# Altium schematic symbol library BARKO_SCHLIB.SchLib: 1064 symbols (part 4 of 11) (continued)
## IC-CD4013BM96G4 (continued)
IC FF D-TYPE DUAL 1BIT 14SOIC; Manufacturer: Texas Instruments; Manufacturer Part Number: CD4013BM96G4; Polarity: Non-Inverting; Frequency: 24MHz; Logic Function: AND,D-Type; Max Supply Voltage: 18V; Min Supply Voltage: 3V; Number of Bits: 2; Propagation Delay: 300ns; Clock Edge Trigger Type: Positive Edge; Turn-On Delay Time: 45ns; High Level Output Current: -4.2mA; Low Level Output Current: 6.8mA; Number of Bits per Element: 1; Number of Outputs: 4; Quiescent Current: 20uA; Washability: OK; .Creator: M.OZKAN; .PCBCHK: USED; Supplier 1: Digi-Key; Supplier Part Number 1: 296-31487-1-ND; Stock: 8095; Pricing: 1=0.41, 10=0.353, 25=0.3292, 100=0.2632, 250=0.2444, 500=0.2068, 1000=0.1598 (USD); RoHS: Yes; Mount: Surface Mount; Case/Package: SOIC; Number of Pins: 14; Weight: 0.004564oz; Contact Plating: Gold; Min Operating Temperature: -55°C; Max Operating Temperature: 125°C; Packaging: Tape and Reel; Number of Elements: 2; Number of Circuits: 2; Package Quantity: 2500; Number of Input Lines: 1; Number of Output Lines: 1; Length: 8.65mm; Height: 1.58mm; Width: 3.91mm; Radiation Hardening: No; Lead Free: Lead Free; ComponentLink1URL: https://datasheet.ciiva.com/26054/cd4013b-mil-26054901.pdf?src-supplier=Avnet+Europe; ComponentLink1Description: https://datasheet.ciiva.com/26054/cd4013b-mil-26054901.pdf?src-supplier=Avnet+Europe; .SCHCHK: USED
footprint SOIC14
pins: 1 Q1 (out), 2 Q1 (out), 3 CLOCK1 (in), 4 RESET1 (in), 5 D1 (in), 6 SET1 (in), 7 VSS (power), 8 SET2 (in), 9 D2 (in), 10 RESET2 (in), 11 CLOCK2 (in), 12 Q2 (out), 13 Q2 (out), 14 VDD (power)

## IC-CD4066BM96
designator U?, comment CD4066BM96  Case/Package: SOIC14
IC QUAD BILATERAL SWITCH 14-SOIC; Manufacturer: Texas Instruments; Number of Inputs: 4; Min Supply Voltage: 3V; Max Supply Voltage: 18V; Supply Type: Dual,Single; Min Dual Supply Voltage: 1.5V; Max Dual Supply Voltage: 9V; Bandwidth: 40MHz; Dual Supply Voltage: 7.5V; On-State Resistance: 240R; Turn-On Delay Time: 30ns; Max Supply Current: 5uA; Polarity: Non-Inverting; Throw Configuration: SPST; Quiescent Current: 20nA; .PCBCHK: USED; .Creator: F:TALI; Washability: OK; Supplier 1: Digi-Key; Manufacturer Part Number: CD4066BM96; Stock 1: 71359; Pricing 1: 1=0.42, 10=0.363, 100=0.2711, 500=0.213, 1000=0.16459 (USD); Mount: Surface Mount; Number of Pins: 14; Weight: 0.004318oz; Contact Plating: Gold; Min Operating Temperature: -55°C; Max Operating Temperature: 125°C; Number of Outputs: 4; Packaging: Tape and Reel; Package Quantity: 2500; Independent Circuits: 4; Number of Channels: 4; Turn-Off Delay Time: 30ns; Number of Bits: 4; Length: 8.65mm; Height: 1.58mm; Width: 3.91mm; Radiation Hardening: No; Lead Free: Lead Free; REACH SVHC: No SVHC; ComponentLink1URL: http://www.farnell.com/datasheets/1874823.pdf; ComponentLink1Description: http://www.farnell.com/datasheets/1874823.pdf; ComponentLink2URL: http://www.ti.com/lit/ds/symlink/cd4066b.pdf; ComponentLink2Description: http://www.ti.com/lit/ds/symlink/cd4066b.pdf; ComponentLink3URL: http://www.ti.com/general/docs/lit/getliterature.tsp?genericPartNumber=CD4066B-MIL&&fileType=pdf; ComponentLink3Description: http://www.ti.com/general/docs/lit/getliterature.tsp?genericPartNumber=CD4066B-MIL&&fileType=pdf; ComponentLink4URL: https://www.verical.com/server-webapp/html/getDatasheet?partID=50227; ComponentLink4Description: https://www.verical.com/server-webapp/html/getDatasheet?partID=50227; ComponentLink5URL: http://focus.ti.com/lit/ds/symlink/cd4066b.pdf; ComponentLink5Description: http://focus.ti.com/lit/ds/symlink/cd4066b.pdf; Supplier Part Number 1: 296-14475-6-ND; .SCHCHK: USED
footprint SOIC14
pins: 1 SIGA-IN/OUT, 2 SIGA-OUT/IN, 3 SIGB-OUT/IN, 4 SIGB-IN/OUT, 5 CONTROLB, 6 CONTROLC, 7 GND, 8 SIGC-IN/OUT, 9 SIGC-OUT/IN, 10 SIGD-OUT/IN, 11 SIGD-/IN/OUT, 12 CONTROLD, 13 CONTROLA, 14 VCC

## IC-CD4067BM96G4
designator U?, comment CD4067BM96G4  Case/Package: SOIC24
IC MUX/DEMUX 1X16 24SOIC; Manufacturer: Texas Instruments; Bandwidth: 14MHz; Min Supply Voltage: 3V; Max Supply Voltage: 18V; On-State Resistance: 240R; Turn-On Delay Time: 650ns; Turn-Off Delay Time: 440ns; Supply Type: Single; Nominal Supply Current: 100uA; Propagation Delay: 60ns; Max Power Dissipation: 500mW; Number of Inputs: 16; Number of Outputs: 1; Operating Supply Current: 80nA; Logic Function: Multiplexer,Demultiplexer; Washability: OK; .Creator: M.OZKAN; .PCBCHK: USED; Supplier 1: Digi-Key; Manufacturer Part Number: CD4067BM96G4; Stock 1: 0; Pricing 1: 2000=0,52269 (USD); RoHS: Yes; Mount: Surface Mount; Number of Pins: 24; Weight: 0.02187oz; Contact Plating: Gold; Min Operating Temperature: -55°C; Max Operating Temperature: 125°C; Packaging: Tape and Reel; Package Quantity: 2000; Number of Channels: 1; Power Dissipation: 500mW; Number of Bits: 16; Lead Free: Lead Free; ComponentLink1URL: https://datasheet.ciiva.com/1682/cd4067b-1682287.pdf?src-supplier=Digi-Key; ComponentLink1Description: https://datasheet.ciiva.com/1682/cd4067b-1682287.pdf?src-supplier=Digi-Key; Supplier Part Number 1: CD4067BM96G4-ND; .SCHCHK: USED
footprint SOIC24
pins: 1 OUT, 2 S7, 3 S6, 4 S5, 5 S4, 6 S3, 7 S2, 8 S1, 9 S0, 10 A, 11 B, 12 GND, 13 D, 14 C, 15 INH, 16 S15, 17 S14, 18 S13, 19 S12, 20 S11, 21 S10, 22 S9, 23 S8, 24 VCC

## IC-CPC1117NTR
designator U?, comment CPC1117NTR  Case/Package: SOP4
SSR RELAY SPST-NC 150MA 0-60V; Manufacturer: Ixys Clare; Output Voltage: 60V; Throw Configuration: SPST; On-State Resistance: 16R; Isolation Voltage: 1.5kV; Max Input Current: 50mA; Voltage Rating: 50V; Contact Resistance: 20mR; Max Voltage Rating (DC): 5.05kV; Current Rating: 1A; Number of Positions: 5; Gender: Male; Connector Type: Male Pin; Pitch: 1mm; Glow Wire Compliant: Non-compliant; Washability: OK; .Creator: M.OZKAN; .PCBCHK: USED; Supplier 1: Future Electronics; Manufacturer Part Number: CPC1117NTR; Stock 1: 93488; Pricing 1: 1=2,60000, 100=1,95000, 250=1,84000, 500=1,77000, 1000=1,69000 (USD); RoHS: Yes; Mount: Surface Mount; Number of Pins: 4; Min Operating Temperature: -40°C; Max Operating Temperature: 85°C; Packaging: Tape and Reel; Max Output Current: 150mA; Package Quantity: 2000; Output Current: 150mA; Termination: Gull Wing; Load Current: 150mA; Max Output Voltage: 60V; Input Current: 50mA; Relay Type: Relay; Length: 4.089mm; Height: 2.184mm; Width: 3.8mm; Radiation Hardening: No; ComponentLink1URL: https://datasheet.ciiva.com/16498/cpc1117ntr-16498380.pdf?src-supplier=Future+Electronics; ComponentLink1Description: https://datasheet.ciiva.com/16498/cpc1117ntr-16498380.pdf?src-supplier=Future+Electronics; ComponentLink2URL: https://datasheet.ciiva.com/2421/cpc1117n-2421253.pdf?src-supplier=Digi-Key; ComponentLink2Description: https://datasheet.ciiva.com/2421/cpc1117n-2421253.pdf?src-supplier=Digi-Key; ComponentLink3URL: https://datasheet.ciiva.com/2421/cpc1117n-2421254.pdf?src-supplier=Digi-Key; ComponentLink3Description: https://datasheet.ciiva.com/2421/cpc1117n-2421254.pdf?src-supplier=Digi-Key; ComponentLink4URL: https://datasheet.ciiva.com/2421/cpc1117n-2421255.pdf?src-supplier=Digi-Key; ComponentLink4Description: https://datasheet.ciiva.com/2421/cpc1117n-2421255.pdf?src-supplier=Digi-Key; ComponentLink5URL: https://datasheet.ciiva.com/39122/3cpc1117n-39122778.pdf?src-supplier=Onlinecomponents.com; ComponentLink5Description: https://datasheet.ciiva.com/39122/3cpc1117n-39122778.pdf?src-supplier=Onlinecomponents.com; Supplier Part Number 1: CPC1117NTR-CUTT; Color: Natural; Contact Plating: Tin; Contact Material: Bronze,Tin; Housing Color: Natural; Housing Material: Nylon; Number of Rows: 1; Voltage Rating (AC): 50V; Fastening Type: Detent; Number of Contacts: 5; Max Voltage Rating (AC): 50V; Contact Gender: Male; Orientation: Vertical; Number of Circuits: 5; Depth: 3.6mm; REACH SVHC: Unknown; Lead Free: Lead Free; ComponentLink6URL: https://datasheet.ciiva.com/11748/0900766b80b0af91-11748006.pdf?src-supplier=RSComponents; ComponentLink6Description: https://datasheet.ciiva.com/11748/0900766b80b0af91-11748006.pdf?src-supplier=RSComponents; ComponentLink7URL: https://datasheet.ciiva.com/30169/101445013310507-pcb-headers-30169975.pdf?src-supplier=Onlinecomponents.com; ComponentLink7Description: https://datasheet.ciiva.com/30169/101445013310507-pcb-headers-30169975.pdf?src-supplier=Onlinecomponents.com; ComponentLink8URL: https://datasheet.ciiva.com/9469/5013310507-pcb-headers-9469065.pdf?src-supplier=Avnet; ComponentLink8Description: https://datasheet.ciiva.com/9469/5013310507-pcb-headers-9469065.pdf?src-supplier=Avnet; ComponentLink9URL: https://datasheet.ciiva.com/5156/5013310507-pcb-headers-179252-5156221.pdf?src-supplier=Mouser; ComponentLink9Description: https://datasheet.ciiva.com/5156/5013310507-pcb-headers-179252-5156221.pdf?src-supplier=Mouser; ComponentLink10URL: https://datasheet.ciiva.com/7683/1631871-7683719.pdf?src-supplier=Element14; ComponentLink10Description: https://datasheet.ciiva.com/7683/1631871-7683719.pdf?src-supplier=Element14; .SCHCHK: USED
footprint SOP_4
pins: 1 A (in), 2 K (out), 3 OUT_AC2 (io), 4 OUT_AC1 (io)

## IC-CPC2017NTR
designator U?, comment CPC2017
RELAY SSR OPTOMOS DUAL NO 8-SOIC; Manufacturer: Ixys Clare; Manufacturer Part Number: CPC2017NTR; Output Current: 120mA; On-State Resistance: 16R; Max Output Voltage: 60V; Isolation Voltage: 1.5kV; Throw Configuration: DPST; Input Current: 50mA; Washability: OK; .Creator: M.OZKAN; .PCBCHK: USED; Supplier 1: Digi-Key; Supplier Part Number 1: 212-CPC2017NCT-ND; Stock 1: 1521; Pricing 1: 1=1.48000, 10=1.38600, 25=1.23200, 50=1.17040, 100=1.10880, 250=0.98560, 500=0.92400, 1000=0.86240 (USD); RoHS: Yes; Mount: Surface Mount; Case/Package: SOP; Min Operating Temperature: -40°C; Max Operating Temperature: 85°C; Package Quantity: 2000; Packaging: Tape and Reel; Load Current: 120mA; Termination: Gull Wing; Relay Type: Relay; Radiation Hardening: No; Lead Free: Lead Free; ComponentLink1URL: http://components.arrow.com/part/dataview/57219127S8988520N2018?src-supplier=Arrow; ComponentLink1Description: http://components.arrow.com/part/dataview/57219127S8988520N2018?src-supplier=Arrow; ComponentLink2URL: http://www.mouser.com/ds/2/205/CPC2017N-275017.pdf?src-supplier=Mouser; ComponentLink2Description: http://www.mouser.com/ds/2/205/CPC2017N-275017.pdf?src-supplier=Mouser; ComponentLink3URL: http://www.ixysic.com/home/pdfs.nsf/www/CPC2017N.pdf/file/CPC2017N.pdf?src-supplier=Digi-Key; ComponentLink3Description: http://www.ixysic.com/home/pdfs.nsf/www/CPC2017N.pdf/file/CPC2017N.pdf?src-supplier=Digi-Key; .SCHCHK: USED
footprint 8-SOP 2.54mm Pitch (8-SOP (0.150", 3.81mm Width))
pins: 1, 2, 3, 4, 5, 6, 7, 8

## IC-CSR1010A05-IQQM-R
designator U?, comment CSR1010A05-IQQM-R  Package: QFN-32
IC RF TXRX+MCU BLUETOOTH 32UFQFN; Manufacturer: Qualcomm; .Creator: F:TALI; .PCBCHK: USED; Washability: OK; Supplier 1: Digi-Key; Manufacturer Part Number: CSR1010A05-IQQM-R; Stock 1: 14468; Pricing 1: 1=2.57, 10=2.323, 25=2.0736, 100=1.8664, 250=1.659, 500=1.45162, 1000=1.20278 (USD); Supplier Part Number 1: CSR1010A05-IQQM-RDKR-ND; .SCHCHK: USED
footprint QFN-32
pins: 0 GND, 1 VDD_BAT, 2 XTAL_32K_OUT, 3 XTAL_32K_IN, 4 WAKE, 5 VDD_CORE, 6 VDD_REG_IN, 7 RF, 8 VDD_XTAL, 9 XTAL_16M_OUT, 10 XTAL_16M_IN, 11 AIO[2], 12 AIO[1], 13 AIO[0], 14 PIO[1] /UART_TX, 15 PIO[1] /UART_RX, 16 PIO[3] /SF_DIN, 17 PIO[4] /SF_CS#, 18 PIO[5] /DEBUG_CLK, 19 PIO[6] /DEBUG_CS#, 20 PIO[7] /DEBUG_MOSI, 21 VDD_PADS, 22 PIO[8] /DEBUG_MISO, 23 PIO[9], 24 PIO[10], 25 PIO[11], 26 SPI_PIO#, 27 PIO[2], 28 I2C_SCL, 29 I2C_SDA, 30 VDD_CORE, 31 SMPS_LX, 32 VDD_BAT_SMPS

## IC-DAC5311IDCKR
designator U?, comment DAC5311
IC DAC 8BIT 1CH LP SC70-6; Manufacturer: Texas Instruments; Manufacturer Part Number: DAC5311IDCKR; Number of Channels: 1; Max Supply Voltage: 5.5V; Min Supply Voltage: 2V; Max Power Dissipation: 880uW; Interface: SPI; Settling Time: 6us; Number of Bits: 8; Resolution: 8b; Sampling Rate: 225KS/s; Supply Type: Single; Integral Nonlinearity (INL): 0.25LSB; Spurious-free dynamic range (SFDR): 65dB; Signal to Noise Ratio (SNR): 81dB; Nominal Supply Current: 110uA; Polarity: Unipolar; Output Type: Voltage; .Creator: F:TALI; .PCBCHK: USED; Washability: OK; Supplier 1: Digi-Key; Supplier Part Number 1: 296-24180-6-ND; Stock 1: 19970; Pricing 1: 1=1.5, 10=1.337, 100=1.0424, 500=0.86108, 1000=0.6798 (USD); Case/Package: SC; Number of Pins: 6; Contact Plating: Gold; Min Operating Temperature: -40°C; Max Operating Temperature: 125°C; Packaging: Tape and Reel; Package Quantity: 3000; Number of DAC Channels: 1; Number of Converters: 1; Conversion Rate: 225KS/s; Differential Nonlinearity: 0.25LSB; Radiation Hardening: No; REACH SVHC: No SVHC; Lead Free: Lead Free; ComponentLink1URL: http://www.farnell.com/datasheets/1725053.pdf?src-supplier=Element14; ComponentLink1Description: http://www.farnell.com/datasheets/1725053.pdf?src-supplier=Element14; ComponentLink2URL: http://www.ti.com/lit/ds/symlink/dac5311.pdf?src-supplier=Digi-Key; ComponentLink2Description: http://www.ti.com/lit/ds/symlink/dac5311.pdf?src-supplier=Digi-Key; ComponentLink3URL: http://www.produktinfo.conrad.com/datenblaetter/1100000-1199999/001186518-da-01-en-IC_DAC_8BIT_1CH_DAC5311IDCKR_SC_70_6_TID.pdf?src-supplier=Conrad; ComponentLink3Description: http://www.produktinfo.conrad.com/datenblaetter/1100000-1199999/001186518-da-01-en-IC_DAC_8BIT_1CH_DAC5311IDCKR_SC_70_6_TID.pdf?src-supplier=Conrad; .SCHCHK: USED
footprint SOT-363
pins: 1 ~{SYNC}, 2 SCLK, 3 DIN, 4 AVDD, 5 GND, 6 VOUT

## IC-DMG6968UDM-7
designator U?, comment DMG6968
MOSFET 2N-CH 20V 6.5A SOT-26; Manufacturer: Diodes; Manufacturer Part Number: DMG6968UDM-7; Number of Channels: 2; Element Configuration: Dual; Gate to Source Voltage (Vgs): 8V; On-State Resistance: 24mR; Power Dissipation: 850mW; Turn-Off Delay Time: 562ns; Turn-On Delay Time: 53ns; Fall Time: 234ns; Input Capacitance: 143pF; Rise Time: 78ns; FET Type: 2 N-Channel; Washability: OK; .Creator: M.OZKAN; .PCBCHK: USED; RoHS: Yes; Category: MOSFETs; Mount: Surface Mount; Case/Package: SOT-26; Number of Pins: a; Min Operating Temperature: -55°C; Max Operating Temperature: 150°C; Drain to Source Voltage (Vdss): 20V; Continuous Drain Current (ID): 6.5A; Drain to Source Breakdown Voltage: 20V; Drain to Source Resistance: 24mR; Package Quantity: 3000; Packaging: Tape and Reel; Rds On Max: 24mR; Max Power Dissipation: 850mW; Number of Elements: 2; Length: 3mm; Height: 1.1mm; Width: 1.6mm; Radiation Hardening: No; REACH SVHC: No SVHC; Lead Free: Lead Free; ComponentLink1URL: https://datasheet.ciiva.com/929/ds31758-929568.pdf?src-supplier=Digi-Key; ComponentLink1Description: https://datasheet.ciiva.com/929/ds31758-929568.pdf?src-supplier=Digi-Key; ComponentLink2URL: https://datasheet.ciiva.com/11174/ds31758-11174898.pdf?src-supplier=Avnet; ComponentLink2Description: https://datasheet.ciiva.com/11174/ds31758-11174898.pdf?src-supplier=Avnet; ComponentLink3URL: https://datasheet.ciiva.com/4443/ds31758-90272-4443012.pdf?src-supplier=Mouser; ComponentLink3Description: https://datasheet.ciiva.com/4443/ds31758-90272-4443012.pdf?src-supplier=Mouser; ComponentLink4URL: https://datasheet.ciiva.com/929/ds31758-929569.pdf?src-supplier=Digi-Key; ComponentLink4Description: https://datasheet.ciiva.com/929/ds31758-929569.pdf?src-supplier=Digi-Key; Supplier 1: Digi-Key; Supplier Part Number 1: DMG6968UDMDICT-ND; Stock: 55957; Pricing: 1=0.44, 10=0.379, 25=0.3536, 100=0.2626, 250=0.2495, 500=0.205, 1000=0.1667 (USD); .SCHCHK: USED
footprint SOT23-6
pins: 1 S1, 2 D1/D2, 3 S2 , 4 G2, 5 D1/D2, 6 G1

## IC-DS1683S+T&R
designator U?, comment DS1683S
IC REAL TIME EVENT REC 8SOIC; Manufacturer: Maxim; Manufacturer Part Number: DS1683S+T&R; Interface: I2C,Serial,2-Wire; Time Format: Binary; Memory Size: 16B; Logic Function: Clock; Supplier 1: Digi-Key; Supplier Part Number 1: DS1683S+T&RCT-ND; Stock: 3510; Pricing: 1=4.38, 10=3.932, 25=3.7172, 100=3.2217, 250=3.0565, 500=2.7426, 1000=2.313 (USD); RoHS: Yes; Mount: Surface Mount; Case/Package: SOIC; Number of Pins: 8; Min Operating Temperature: -40°C; Max Operating Temperature: 85°C; Package Quantity: 2500; Packaging: Tape and Reel; Date Format: Binary; ComponentLink1URL: https://datasheet.ciiva.com/14244/ds1683-14244282.pdf?src-supplier=Avnet; ComponentLink1Description: https://datasheet.ciiva.com/14244/ds1683-14244282.pdf?src-supplier=Avnet
footprint SOIC8
pins: 1 EVENT, 2 NC, 3 ALARM, 4 GND, 5 SCL, 6 SDA, 7 NC, 8 VCC

## IC-EL3H7(B)(TA)-VG
designator U?, comment EL3H7(B)(TA)-VG
OPTOISOLATOR 3.75KV TRANS 4-SSOP; Manufacturer: Everlight; Max Output Voltage: 80V; Output Current per Channel: 50mA; Collector Emitter Saturation Voltage: 200mV; Fall Time: 18000ns; Number of Elements: 1; Power Dissipation: 200mW; Current Transfer Ratio: 260%; Forward Voltage: 1.4V; Reverse Breakdown Voltage: 6V; Approvals: UL; Supplier 1: Digi-Key; Supplier Part Number 1: 1080-1197-1-ND; Manufacturer Part Number: EL3H7(B)(TA)-VG; Stock: 190343; Pricing: 1=0.47, 10=0.333, 100=0.1957, 500=0.1354, 1000=0.1128, 2000=0.1015 (USD); RoHS: Yes; Mount: Surface Mount; Case/Package: SSOP; Number of Pins: 4; Min Operating Temperature: -55°C; Max Operating Temperature: 125°C; Max Input Current: 50mA; Max Collector Current: 50mA; Isolation Voltage: 3.75kV; Collector Emitter Breakdown Voltage: 80V; Packaging: Tape and Reel; Package Quantity: 1; Number of Channels: 1; Collector Emitter Voltage (VCEO): 80V; Max Power Dissipation: 200mW; Forward Current: 50mA; Rise Time: 18000ns; Radiation Hardening: No; Lead Free: Lead Free; ComponentLink1URL: https://datasheet.ciiva.com/2086/el3h7-g-series-2086501.pdf?src-supplier=Digi-Key; ComponentLink1Description: https://datasheet.ciiva.com/2086/el3h7-g-series-2086501.pdf?src-supplier=Digi-Key; ComponentLink2URL: https://datasheet.ciiva.com/2086/el3h7-g-series-2086502.pdf?src-supplier=Digi-Key; ComponentLink2Description: https://datasheet.ciiva.com/2086/el3h7-g-series-2086502.pdf?src-supplier=Digi-Key; ComponentLink3URL: https://datasheet.ciiva.com/2086/el3h7-g-series-2086503.pdf?src-supplier=Digi-Key; ComponentLink3Description: https://datasheet.ciiva.com/2086/el3h7-g-series-2086503.pdf?src-supplier=Digi-Key; ComponentLink4URL: https://datasheet.ciiva.com/15209/getdatasheetpartid-416716-15209115.pdf?src-supplier=Verical; ComponentLink4Description: https://datasheet.ciiva.com/15209/getdatasheetpartid-416716-15209115.pdf?src-supplier=Verical
footprint SOIC4
pins: 1, 2, 3, 4

## IC-HEF4011BT,653
designator U?, comment HEF4011BT  Case/Package: SOIC14
IC GATE NAND 4CH 2-INP SOIC14; Manufacturer: NXP Semiconductors; Manufacturer Part Number: HEF4011BT,653; Output Current: 2.4mA; Max Supply Voltage: 15V; Min Supply Voltage: 3V; Quiescent Current: 1uA; Propagation Delay: 110ns; Number of Outputs: 1; Number of Inputs: 2; Number of Circuits: 4; High Level Output Current: -4.2mA; Low Level Output Current: 4.2mA; Turn-On Delay Time: 20ns; .PCBCHK: USED; .Creator: F:TALI; Washability: OK; Supplier 1: Digi-Key; Stock 1: 0; Mount: Surface Mount; Number of Pins: 14; Contact Plating: Gold; Min Operating Temperature: -40°C; Max Operating Temperature: 125°C; Packaging: Tape and Reel; Logic Function: NAND; Package Quantity: 1; Number of Gates: 4; Number of Input Lines: 2; Number of Output Lines: 1; Number of Elements: 4; Voltage: 15V; Radiation Hardening: No; REACH SVHC: No SVHC; Lead Free: Lead Free; ComponentLink1URL: http://www.nxp.com/documents/data_sheet/HEF4011B.pdf; ComponentLink1Description: http://www.nxp.com/documents/data_sheet/HEF4011B.pdf; ComponentLink2URL: https://www.verical.com/server-webapp/html/getDatasheet?partID=246727; ComponentLink2Description: https://www.verical.com/server-webapp/html/getDatasheet?partID=246727; ComponentLink3URL: http://www.farnell.com/datasheets/2051437.pdf; ComponentLink3Description: http://www.farnell.com/datasheets/2051437.pdf; Supplier Part Number 1: 568-8223-1-ND; .SCHCHK: USED
footprint SOIC14
pins: 1 1A, 2 1B, 3 1Y, 4 2Y, 5 2A, 6 2B, 7 GND, 8 3A, 9 3B, 10 3Y, 11 4Y, 12 4A, 13 4B, 14 VCC

## IC-HEF4051BT,653
designator U?, comment HEF4051BT
IC MUX/DEMUX 8X1 16SOIC; Manufacturer: Nexperia USA; Manufacturer Part Number: HEF4051BT,653; Washability: OK; .Creator: M.OZKAN; .PCBCHK: USED; Supplier 1: Digi-Key; Stock 1: 5426; Pricing 1: 1=0,45000, 10=0,38500, 25=0,35960, 100=0,28760, 250=0,26704, 500=0,22596, 1000=0,17461 (USD); RoHS: No; ComponentLink1URL: https://assets.nexperia.com/documents/data-sheet/HEF4051B.pdf?src-supplier=Digi-Key; ComponentLink1Description: https://assets.nexperia.com/documents/data-sheet/HEF4051B.pdf?src-supplier=Digi-Key; Supplier Part Number 1: 1727-2947-1-ND; .SCHCHK: USED
footprint SOIC16
pins: 1 Y4, 2 Y6, 3 Z, 4 Y7, 5 Y5, 6 ~{E}, 7 VEE, 8 VSS, 9 S3, 10 S2, 11 S1, 12 Y3, 13 Y0, 14 Y1, 15 Y2, 16 VDD

## IC-HT0440LG-G
designator IC?, comment HT0440LG-G
IC GATE DRVR HIGH-SIDE 8SOIC; Manufacturer: Microchip Supertex; Output Voltage: 10V; Min Supply Voltage: -500mV; Max Supply Voltage: 7V; Rise Time: 650000ns; Frequency: 2MHz; Nominal Supply Current: 2mA; Number of Outputs: 2; Fall Time: 3000000ns; Turn-On Delay Time: 50us; Turn-Off Delay Time: 150us; Supplier 1: Avnet; Manufacturer Part Number: HT0440LG-G; Stock 1: 3300; Pricing 1: 3300=1.45140, 6600=1.43960, 13200=1.42780, 19800=1.41600, 26400=1.40420 (USD); RoHS: Yes; Mount: Surface Mount; Case/Package: SOIC; Number of Pins: 8; Min Operating Temperature: -40°C; Max Operating Temperature: 85°C; Packaging: Tape and Reel; Package Quantity: 2500; Number of Drivers: 2; ComponentLink1URL: https://datasheet.ciiva.com/15747/ht0440-15747219.pdf?src-supplier=Onlinecomponents.com; ComponentLink1Description: https://datasheet.ciiva.com/15747/ht0440-15747219.pdf?src-supplier=Onlinecomponents.com; ComponentLink2URL: https://datasheet.ciiva.com/30089/729ht0440-30089404.pdf?src-supplier=Onlinecomponents.com; ComponentLink2Description: https://datasheet.ciiva.com/30089/729ht0440-30089404.pdf?src-supplier=Onlinecomponents.com; Supplier Part Number 1: HT0440LG-G
footprint SOIC8-D0008A_M (SOIC, 8-Leads, Body 5x4mm, Pitch 1.27mm, IPC Low Density)
pins: 1 A, 2 CLK, 3 -VOUTA, 4 +VOUTA, 5 +VOUTB, 6 -VOUTB, 7 GND, 8 B

## IC-INA240A3PWR
designator U?, comment INA240A3PWR
IC AMP CURRENT SENSE 8-TSSOP; Manufacturer: Texas Instruments; Number of Circuits: 1; Slew Rate: 2V/µs; -3db Bandwidth: 400kHz; Input Bias Current: 90uA; Input Offset Voltage (Vos): 5uV; Operating Supply Current: 1.8mA; Number of Poles: 2; Fail Short: No; Approvals: UL; Supplier 1: Digi-Key; Supplier Part Number 1: 296-45090-1-ND; Manufacturer Part Number: INA240A3PWR; Stock: 8804; Pricing: 1=2.78, 10=2.499, 25=2.3624, 100=1.9425, 250=1.743, 500=1.68, 1000=1.3965 (USD); RoHS: No; Mount: Surface Mount; Case/Package: TSSOP; Number of Pins: 8; Min Operating Temperature: -40°C; Max Operating Temperature: 125°C; Packaging: Tape and Reel; ComponentLink1URL: http://www.ti.com/general/docs/lit/getliterature.tsp?genericPartNumber=INA240&fileType=pdf&src-supplier=Farnell; ComponentLink1Description: http://www.ti.com/general/docs/lit/getliterature.tsp?genericPartNumber=INA240&fileType=pdf&src-supplier=Farnell; ComponentLink2URL: http://www.ti.com/lit/ds/symlink/ina240.pdf?src-supplier=Digi-Key; ComponentLink2Description: http://www.ti.com/lit/ds/symlink/ina240.pdf?src-supplier=Digi-Key; Weight: 12.345887oz; Contact Plating: Tin; Number of Terminals: 2; Termination: SMD/SMT; Package Quantity: 1500; Length: 5mm; Depth: 5mm; REACH SVHC: No SVHC; ComponentLink3URL: https://datasheet.ciiva.com/4498/2031-xxt-72636-4498914.pdf?src-supplier=Mouser; ComponentLink3Description: https://datasheet.ciiva.com/4498/2031-xxt-72636-4498914.pdf?src-supplier=Mouser; ComponentLink4URL: https://datasheet.ciiva.com/30051/2902031-xxt-30051287.pdf?src-supplier=Onlinecomponents.com; ComponentLink4Description: https://datasheet.ciiva.com/30051/2902031-xxt-30051287.pdf?src-supplier=Onlinecomponents.com; ComponentLink5URL: https://datasheet.ciiva.com/323/2031-xxt-323225.pdf?src-supplier=Digi-Key; ComponentLink5Description: https://datasheet.ciiva.com/323/2031-xxt-323225.pdf?src-supplier=Digi-Key; ComponentLink6URL: https://datasheet.ciiva.com/323/2031-xxt-323226.pdf?src-supplier=Digi-Key; ComponentLink6Description: https://datasheet.ciiva.com/323/2031-xxt-323226.pdf?src-supplier=Digi-Key; ComponentLink7URL: https://datasheet.ciiva.com/323/2031-xxt-323227.pdf?src-supplier=Digi-Key; ComponentLink7Description: https://datasheet.ciiva.com/323/2031-xxt-323227.pdf?src-supplier=Digi-Key
footprint 8-TSSOP
pins: 1 NC, 2 IN+ (hiz), 3 IN- (hiz), 4 GND (power), 5 VS (power), 6 REF2, 7 REF1, 8 OUT (out)
text: -; +

## IC-ISO1176TDWR
designator IC?, comment ISO1176TDWR
DG ISO 2.5KV RS422/RS485 16SOIC; Manufacturer: Texas Instruments; Min Supply Voltage: 3V; Max Supply Voltage: 5.5V; Number of Receivers: 1; Data Rate: 40Mbps; Logic Function: Transceiver; Simplex/Duplex: Half Duplex; Working Voltage: 566V; Supplier 1: Mouser; Manufacturer Part Number: ISO1176TDWR; Stock 1: 1426; Pricing 1: 1=6,19000, 10=5,59000, 25=5,34000, 100=4,42000, 250=4,03000, 500=3,77000 (USD); RoHS: Yes; Case/Package: SOIC; Number of Pins: 16; Min Operating Temperature: -40°C; Max Operating Temperature: 85°C; Packaging: Tape and Reel; Package Quantity: 2000; Number of Transmitters: 1; Number of Transceivers: 1; Radiation Hardening: No; Lead Free: Lead Free; ComponentLink1URL: https://datasheet.ciiva.com/14427/sllse28d-14427234.pdf?src-supplier=Avnet; ComponentLink1Description: https://datasheet.ciiva.com/14427/sllse28d-14427234.pdf?src-supplier=Avnet; ComponentLink2URL: https://datasheet.ciiva.com/26159/sllse28d-26159587.pdf?src-supplier=Avnet+Europe; ComponentLink2Description: https://datasheet.ciiva.com/26159/sllse28d-26159587.pdf?src-supplier=Avnet+Europe; ComponentLink3URL: https://datasheet.ciiva.com/1772/iso1176t-1772763.pdf?src-supplier=Digi-Key; ComponentLink3Description: https://datasheet.ciiva.com/1772/iso1176t-1772763.pdf?src-supplier=Digi-Key; Supplier Part Number 1: 595-ISO1176TDWR
footprint SOIC-16 7.3mm clearance (SOIC, 16-Leads, Body 10,30x7,50mm, Pitch 1,27mm, IPC Medium Density)
pins: 1 D1, 2 D2, 3 GND1, 4 VCC1, 5 R, 6 ~{RE}, 7 DE, 8 D, 9 GND2, 10 ISODE, 11 GND2, 12 A, 13 B, 14 GND2, 15 GND2, 16 VCC2

## IC-ISO1430
designator U?, comment ISO1430
ISO RS485/422 12MBPS HD 5KVRMS; Manufacturer: Texas Instruments; Manufacturer Part Number: ISO1430BDWR; Supplier 1: Digi-Key; Stock 1: 1502; Pricing 1: 1=5,67000, 10=5,09300, 25=4,81520, 100=3,95900, 250=3,55240, 500=3,42400, 1000=2,84620 (USD); RoHS: No; Supplier Part Number 1: 296-ISO1430BDWRCT-ND
footprint SOIC-16 (SOIC, 16-Leads, Body 10,30x7,50mm, Pitch 1,27mm, Thermal Pad 3,10x2,40mm, IPC Medium Density)
pins: 1 VCC1, 2 GND1_2, 3 R (out), 4 ~{RE} (in), 5 DE (in), 6 D (in), 7 NC, 8 GND1_1, 9 GND2_1, 10 NC, 11 NC, 12 A, 13 B, 14 NC, 15 GND2_2, 16 VCC2
text: ISO

## IC-ITS4060SSJNXUMA1
designator U?, comment ITS4060SS
IC SWITCH PWR HISIDE 8DSO; Manufacturer: Infineon; Manufacturer Part Number: ITS4060SSJNXUMA1; Number of Outputs: 1; On-State Resistance: 120mR; Turn-Off Delay Time: 230us; Turn-On Delay Time: 180us; Max Power Dissipation: 1.5W; Nominal Supply Current: 800uA; Max Supply Voltage: 34V; Supplier 1: Digi-Key; Supplier Part Number 1: ITS4060SSJNXUMA1CT-ND; Stock: 3258; Pricing: 1=1.49, 10=1.334, 25=1.2584, 100=1.0068, 250=0.881, 500=0.8558, 1000=0.6796 (USD); RoHS: Yes; Mount: Surface Mount; Case/Package: SOIC; Number of Pins: 8; Min Operating Temperature: -40°C; Max Operating Temperature: 125°C; Packaging: Tape and Reel; Package Quantity: 2500; Number of Channels: 1; Operating Supply Voltage: 34V; Lead Free: Lead Free; Halogen Free: Halogen Free; ComponentLink1URL: http://www.mouser.com/ds/2/196/Infineon-ITS4060S_SJ_N_01092012S-DS-v01_00-en-780445.pdf?src-supplier=Mouser; ComponentLink1Description: http://www.mouser.com/ds/2/196/Infineon-ITS4060S_SJ_N_01092012S-DS-v01_00-en-780445.pdf?src-supplier=Mouser; ComponentLink2URL: http://www.mouser.com/ds/2/196/Infineon-ITS4060S_SJ_N_01092012S-DS-v01_00-en-785694.pdf?src-supplier=Mouser; ComponentLink2Description: http://www.mouser.com/ds/2/196/Infineon-ITS4060S_SJ_N_01092012S-DS-v01_00-en-785694.pdf?src-supplier=Mouser; ComponentLink3URL: http://www.farnell.com/datasheets/2211691.pdf?src-supplier=Farnell; ComponentLink3Description: http://www.farnell.com/datasheets/2211691.pdf?src-supplier=Farnell; ComponentLink4URL: https://www.infineon.com/dgdl/Infineon-ITS4060S_SJ_N_01092012S-DS-v01_00-en.pdf?fileId=db3a304339dcf4b1013a0137d230573b&src-supplier=Digi-Key; ComponentLink4Description: https://www.infineon.com/dgdl/Infineon-ITS4060S_SJ_N_01092012S-DS-v01_00-en.pdf?fileId=db3a304339dcf4b1013a0137d230573b&src-supplier=Digi-Key; ComponentLink5URL: http://www.infineon.com/dgdl/Infineon-ITS4060S_SJ_N_01092012S-DS-v01_00-en.pdf?fileId=db3a304339dcf4b1013a0137d230573b&sd=t&src-supplier=Avnet; ComponentLink5Description: http://www.infineon.com/dgdl/Infineon-ITS4060S_SJ_N_01092012S-DS-v01_00-en.pdf?fileId=db3a304339dcf4b1013a0137d230573b&sd=t&src-supplier=Avnet
footprint SOIC8-D0008A_M (SOIC, 8-Leads, Body 5x4mm, Pitch 1.27mm, IPC Low Density)
pins: 1 GND (power) "Logic ground", 2 IN (in) "Input, controles the power switch; the powerswitch is ON when high", 3 OUT (power) "Output to the load", 4 NC "Not connected", 5 VS (power) "Supply voltage (design the wiring for the maximum short circuit current and also for low thermal resistance)", 6 VS (power) "Supply voltage (design the wiring for the maximum short circuit current and also for low thermal resistance)", 7 VS (power) "Supply voltage (design the wiring for the maximum short circuit current and also for low thermal resistance)", 8 VS (power) "Supply voltage (design the wiring for the maximum short circuit current and also for low thermal resistance)"

## IC-LIS2DE12TR
designator U?, comment LIS2DE12TR
ACCEL 2-16G I2C/SPI 12LGA; Manufacturer: STMicroelectronics; Bandwidth: 0.5Hz; Min Supply Voltage: 1.7V; Max Supply Voltage: 3.6V; Output Type: SPI,I2C,Digital; Axis: X, Y, Z; Washability: OK; .Creator: M.OZKAN; .PCBCHK: USED; Supplier 1: Digi-Key; Supplier Part Number 1: 497-15997-1-ND; Manufacturer Part Number: LIS2DE12TR; Stock 1: 13696; Pricing 1: 1=1.45000, 10=1.29800, 25=1.23200, 100=1.01200, 500=0.83600, 1000=0.66000 (USD); RoHS: Yes; Mount: Surface Mount; Case/Package: LGA; Number of Pins: 12; Contact Plating: Gold; Min Operating Temperature: -40°C; Max Operating Temperature: 85°C; Packaging: Cut Tape; REACH SVHC: No SVHC; Lead Free: Lead Free; ComponentLink1URL: http://www.farnell.com/datasheets/2028147.pdf?src-supplier=Farnell; ComponentLink1Description: http://www.farnell.com/datasheets/2028147.pdf?src-supplier=Farnell; ComponentLink2URL: https://www.mouser.com/ds/2/389/lis2de12-954977.pdf?src-supplier=Mouser; ComponentLink2Description: https://www.mouser.com/ds/2/389/lis2de12-954977.pdf?src-supplier=Mouser; ComponentLink3URL: http://www.st.com/content/ccc/resource/technical/document/datasheet/group0/72/cb/80/a7/5e/fe/46/9d/DM00153214/files/DM00153214.pdf/jcr:content/translations/en.DM00153214.pdf?src-supplier=Digi-Key; ComponentLink3Description: http://www.st.com/content/ccc/resource/technical/document/datasheet/group0/72/cb/80/a7/5e/fe/46/9d/DM00153214/files/DM00153214.pdf/jcr:content/translations/en.DM00153214.pdf?src-supplier=Digi-Key; ComponentLink4URL: http://www.st.com/st-web-ui/static/active/en/resource/technical/document/datasheet/DM00153214.pdf?src-supplier=Avnet; ComponentLink4Description: http://www.st.com/st-web-ui/static/active/en/resource/technical/document/datasheet/DM00153214.pdf?src-supplier=Avnet; ComponentLink5URL: http://www.farnell.com/datasheets/2028147.pdf?src-supplier=Element14; ComponentLink5Description: http://www.farnell.com/datasheets/2028147.pdf?src-supplier=Element14; ComponentLink6URL: http://www.st.com/st-web-ui/static/active/en/resource/technical/document/datasheet/DM00153214.pdf?src-supplier=Avnet+Asia; ComponentLink6Description: http://www.st.com/st-web-ui/static/active/en/resource/technical/document/datasheet/DM00153214.pdf?src-supplier=Avnet+Asia; .SCHCHK: USED
footprint LGA-12 (LGA, 12-Leads, Body 2.00x2.00mmx1.00mm, Pitch 0.50mm)
pins: 1 SCL/SPC, 2 CS, 3 SDO/SA0, 4 SDA/SDO/SDI, 5 RES, 6 GND_1, 7 GND_2, 8 GND_3, 9 VDD, 10 VDD_IO, 11 INT_2, 12 INT_1

## IC-LM317T
designator U?, comment LM317T  Case/Package: TO-220
IC REG LIN POS ADJ 1.5A TO220AB; Manufacturer: STMicroelectronics; Number of Outputs: 1; Max Input Voltage: 40V; Min Input Voltage: 4.2V; Polarity: Positive; Output Type: Adjustable; Output Voltage: 37V; Min Output Voltage: 1.2V; Power Supply Rejection Ratio (PSRR): 80dB; Reference Voltage: 1.25V; Tolerance: 5%; .PCBCHK: USED; .Creator: F:TALI; Washability: OK; Supplier 1: Digi-Key; Manufacturer Part Number: LM317T; Stock 1: 33255; Pricing 1: 1=0.64, 50=0.5082, 100=0.4066, 500=0.31944, 1000=0.24684 (USD); Mount: Through Hole; Number of Pins: 3; Weight: 0.08113oz; Contact Plating: Matte,Tin; Min Operating Temperature: 0°C; Max Operating Temperature: 125°C; Output Current: 1.5A; Packaging: Rail/Tube; Max Output Current: 1.5A; Package Quantity: 50; Number of Regulators: 1; Max Output Voltage: 37V; Output Configuration: Positive; Length: 10.4mm; Height: 9.15mm; Width: 4.6mm; Radiation Hardening: No; Lead Free: Lead Free; REACH SVHC: No SVHC; ComponentLink1URL: http://www.farnell.com/datasheets/1815554.pdf; ComponentLink1Description: http://www.farnell.com/datasheets/1815554.pdf; ComponentLink2URL: http://www.rapidonline.com/pdf/47-3318.pdf; ComponentLink2Description: http://www.rapidonline.com/pdf/47-3318.pdf; ComponentLink3URL: https://www.distrelec.biz/Web/Downloads/a_/en/tnSTM-LM317_data_en.pdf?mime=application%2Fpdf; ComponentLink3Description: https://www.distrelec.biz/Web/Downloads/a_/en/tnSTM-LM317_data_en.pdf?mime=application%2Fpdf; ComponentLink4URL: http://www.mouser.com/ds/2/389/lm217-974117.pdf; ComponentLink4Description: http://www.mouser.com/ds/2/389/lm217-974117.pdf; ComponentLink5URL: http://www.st.com/content/ccc/resource/technical/document/datasheet/group1/a0/db/e6/9b/6f/9c/45/7b/CD00000455/files/CD00000455.pdf/jcr:content/translations/en.CD00000455.pdf; ComponentLink5Description: http://www.st.com/content/ccc/resource/technical/document/datasheet/group1/a0/db/e6/9b/6f/9c/45/7b/CD00000455/files/CD00000455.pdf/jcr:content/translations/en.CD00000455.pdf; ComponentLink6URL: https://produktinfo.conrad.com/datenblaetter/175000-199999/176001-da-01-en-IC_LM317T.pdf; ComponentLink6Description: https://produktinfo.conrad.com/datenblaetter/175000-199999/176001-da-01-en-IC_LM317T.pdf; Supplier Part Number 1: 497-1575-5-ND; .SCHCHK: USED
footprint TO-220AB
pins: 1 ADJUST, 2 OUTPUT, 3 INPUT

## IC-LM358MX
designator U?, comment LM358MX
IC OPAMP GP 8SOIC; Manufacturer: ON Semiconductor / Fairchild; Min Supply Voltage: 3V; Max Supply Voltage: 32V; Min Dual Supply Voltage: 1.5V; Max Dual Supply Voltage: 16V; Voltage Gain: 100dB; Slew Rate: 0.6V/µs; Number of Channels: 2; Common Mode Rejection Ratio: 65dB; Output Current: 30mA; Nominal Supply Current: 1.2mA; Input Bias Current: 250nA; Input Offset Voltage (Vos): 7mV; Operating Supply Current: 800uA; .PCBCHK: USED; .Creator: F:TALI; Washability: OK; Supplier 1: Digi-Key; Manufacturer Part Number: LM358MX; Stock 1: 16179; Pricing 1: 1=0.47, 10=0.379, 100=0.2578, 500=0.19332, 1000=0.14499 (USD); Mount: Surface Mount; Number of Pins: 8; Weight: 0.2304g; Min Operating Temperature: 0°C; Max Operating Temperature: 70°C; Packaging: Tape and Reel; Package Quantity: 3000; Operating Supply Voltage: 32V; Number of Circuits: 2; Number of Elements: 2; Power Supply Rejection Ratio (PSRR): 65dB; Number of Amplifiers: 2; Output Current per Channel: 30mA; Length: 4.92mm; Height: 1.55mm; Width: 3.95mm; Radiation Hardening: No; REACH SVHC: No SVHC; Lead Free: Lead Free; Supplier Part Number 1: LM358MXFSDKR-ND; .SCHCHK: USED; ComponentLink1Description: Datasheet; ComponentLink1URL: https://www.ti.com/lit/ds/symlink/lm158-n.pdf
footprint SOIC8
part A pins: 1 OUT A (out), 2 -IN A (in), 3 +IN A (in), 4 -V (power), 8 +V (power)
part B pins: 5 +IN A (in), 6 -IN A (in), 7 OUT B (out)
1 alternate drawing of the same symbol

## IC-LM1084
designator U?, comment LM1084
IC REG LIN POS ADJ 5A DDPAK; Manufacturer: TI National Semiconductor; Manufacturer Part Number: LM1084IS-ADJ/NOPB; Max Power Dissipation: 30W; Max Input Voltage: 29V; Dropout Voltage: 1.3V; Output Voltage: 15V; Number of Outputs: 1; Min Input Voltage: 2.6V; Reference Voltage: 1.262V; Polarity: Positive; Min Output Voltage: 1.25V; Quiescent Current: 5mA; Output Type: Adjustable; Supplier 1: Digi-Key; Stock 1: 299; Pricing 1: 1=2,85000, 10=2,55600, 25=2,41640, 100=1,98690, 250=1,78284, 500=1,71840, 1000=1,42842, 2500=1,37472, 5000=1,33176 (USD); RoHS: Yes; Mount: Surface Mount; Case/Package: TO-263; Number of Pins: 3; Weight: 0.25lb; Contact Plating: Tin,Matte; Min Operating Temperature: -40°C; Max Operating Temperature: 125°C; Packaging: Rail/Tube; Output Current: 5A; Max Output Current: 5A; Package Quantity: 45; Power Dissipation: 30W; Max Output Voltage: 15V; Current Rating: 5A; Length: 10.16mm; Height: 4.57mm; Width: 8.64mm; Radiation Hardening: No; REACH SVHC: No SVHC; Lead Free: Contains Lead; ComponentLink1URL: https://datasheet.ciiva.com/27050/835577-27050272.pdf?src-supplier=Jameco; ComponentLink1Description: https://datasheet.ciiva.com/27050/835577-27050272.pdf?src-supplier=Jameco; ComponentLink2URL: https://datasheet.ciiva.com/25626/0900766b807800b5-25626829.pdf?src-supplier=RSComponents; ComponentLink2Description: https://datasheet.ciiva.com/25626/0900766b807800b5-25626829.pdf?src-supplier=RSComponents; ComponentLink3URL: https://datasheet.ciiva.com/1511/1887482-1511673.pdf?src-supplier=Element14; ComponentLink3Description: https://datasheet.ciiva.com/1511/1887482-1511673.pdf?src-supplier=Element14; ComponentLink4URL: https://datasheet.ciiva.com/25974/lm1084-25974378.pdf?src-supplier=Avnet+Europe; ComponentLink4Description: https://datasheet.ciiva.com/25974/lm1084-25974378.pdf?src-supplier=Avnet+Europe; ComponentLink5URL: https://datasheet.ciiva.com/3223/lm1084-3223471.pdf?src-supplier=Avnet; ComponentLink5Description: https://datasheet.ciiva.com/3223/lm1084-3223471.pdf?src-supplier=Avnet; Supplier Part Number 1: LM1084IS-ADJ/NOPB-ND
footprint DPAK254P1404X457-4N
pins: 1 ADJ/GND, 2 OUT, 3 IN

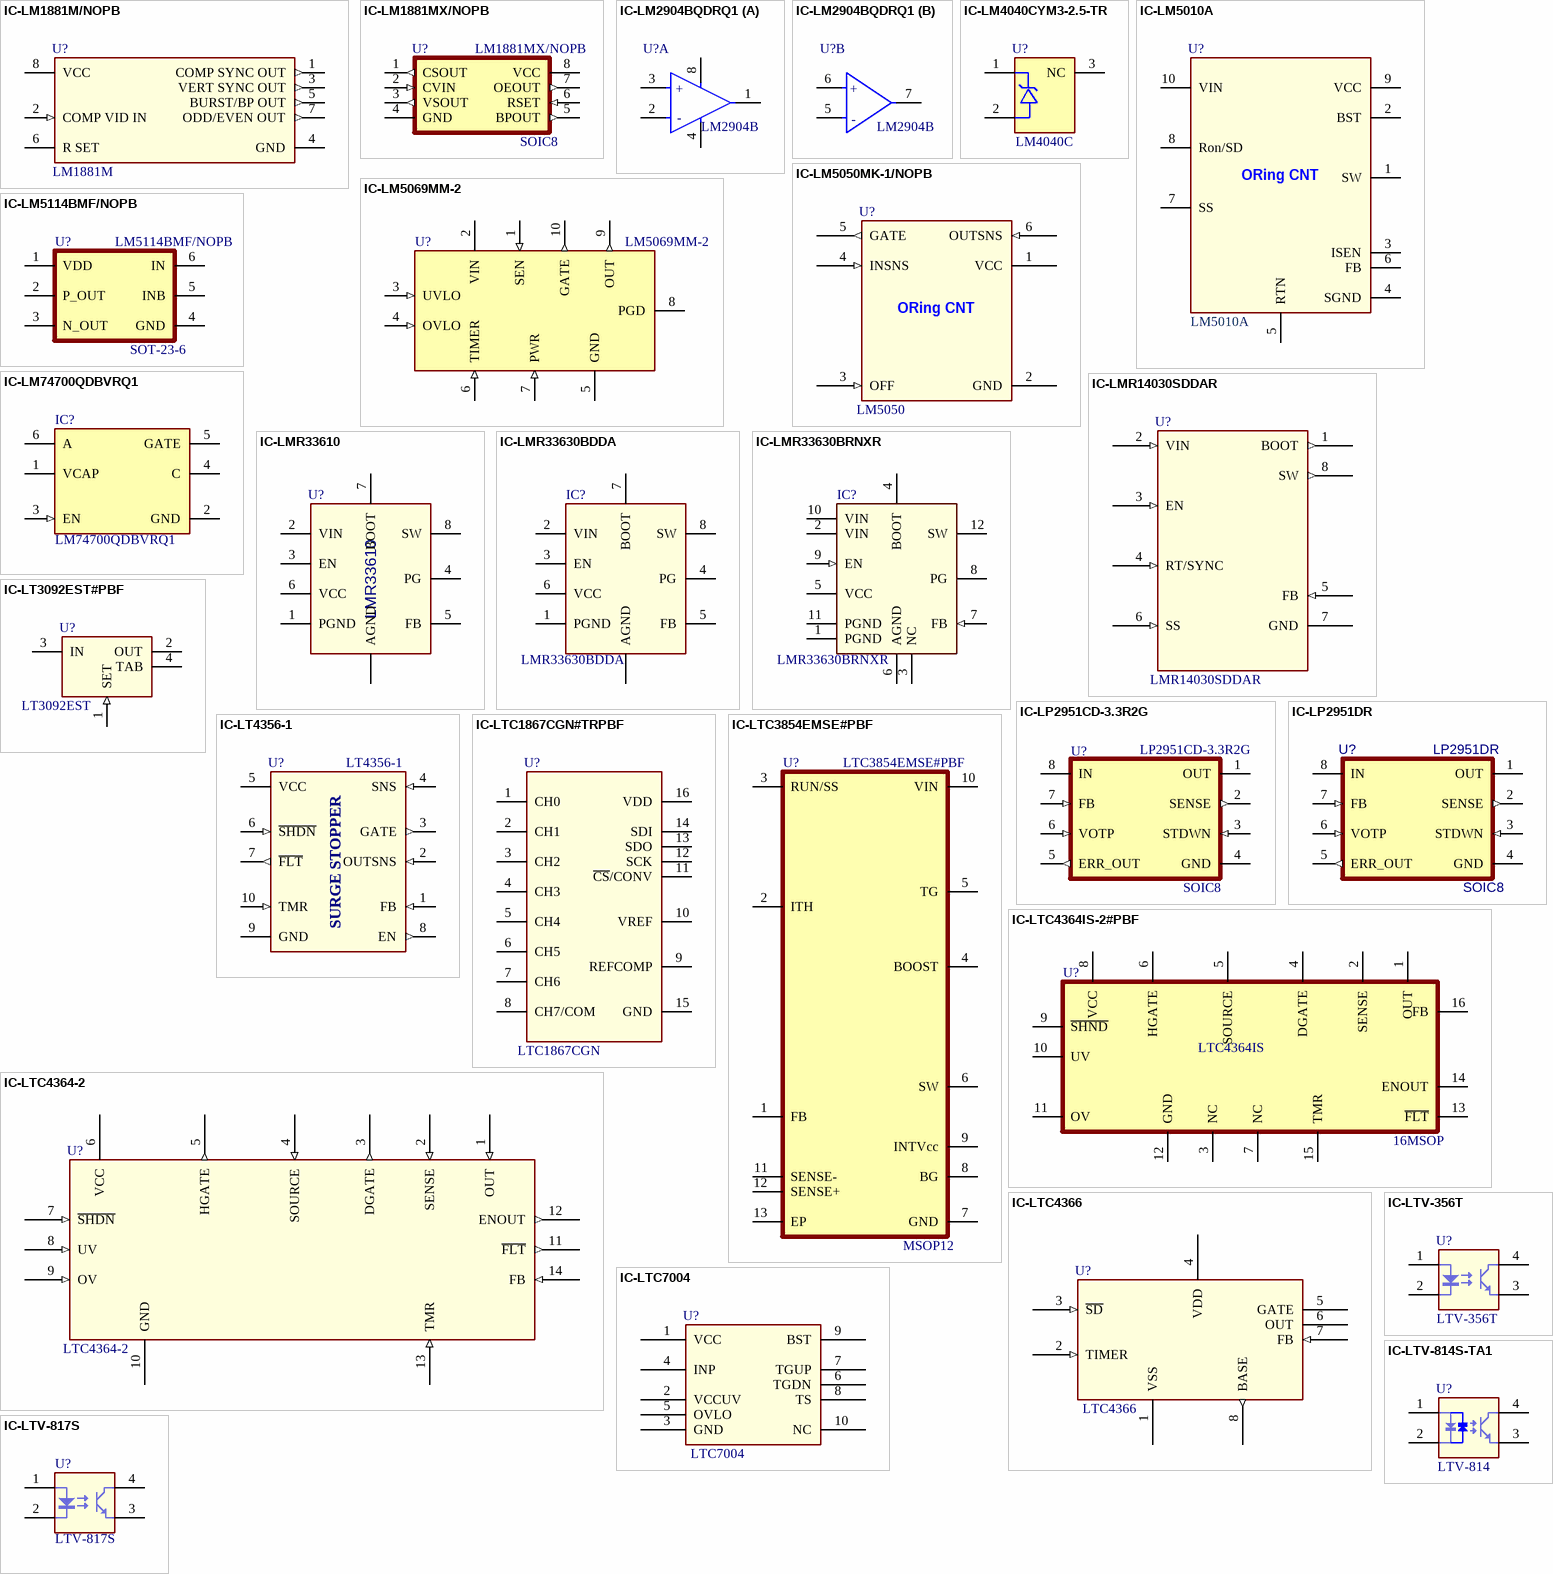
[diagram p14: symbols IC-LM1881M/NOPB to IC-LTV-817S]

## IC-LM1881M/NOPB
designator U?, comment LM1881M
IC VIDEO SYNC SEPARATOR 8SOIC; Manufacturer: TI National Semiconductor; Manufacturer Part Number: LM1881M/NOPB; Min Supply Voltage: 5V; Max Supply Voltage: 12V; Nominal Supply Current: 5.2mA; Power Dissipation: 1.1W; Power Consumption: 25mW; Washability: OK; .Creator: M.OZKAN; .PCBCHK: USED; Supplier 1: Digi-Key; Supplier Part Number 1: LM1881M/NOPB-ND; Stock: 529; Pricing: 1=3.61, 10=3.246, 25=3.0692, 100=2.5234, 250=2.2642, 500=2.1824, 1000=1.8141, 2500=1.7459, 5000=1.6914 (USD); RoHS: Yes; Mount: Surface Mount; Case/Package: SOIC; Number of Pins: 8; Contact Plating: Tin,Matte; Min Operating Temperature: 0°C; Max Operating Temperature: 70°C; Packaging: Rail/Tube; Package Quantity: 95; Voltage: 5V; Max Power Dissipation: 1.1W; Length: 4.9mm; Height: 1.45mm; Width: 3.9mm; Radiation Hardening: No; REACH SVHC: No SVHC; Lead Free: Lead Free; ComponentLink1URL: https://datasheet.ciiva.com/14153/sanat-semico-video-sync-seperator-en-14153233.pdf?src-supplier=Distrelec; ComponentLink1Description: https://datasheet.ciiva.com/14153/sanat-semico-video-sync-seperator-en-14153233.pdf?src-supplier=Distrelec; ComponentLink2URL: https://datasheet.ciiva.com/1172/1839177-1172294.pdf?src-supplier=Element14; ComponentLink2Description: https://datasheet.ciiva.com/1172/1839177-1172294.pdf?src-supplier=Element14; ComponentLink3URL: https://datasheet.ciiva.com/19457/893996-19457288.pdf?src-supplier=Jameco; ComponentLink3Description: https://datasheet.ciiva.com/19457/893996-19457288.pdf?src-supplier=Jameco; ComponentLink4URL: https://datasheet.ciiva.com/15120/getdatasheetpartid-628221-15120012.pdf?src-supplier=Verical; ComponentLink4Description: https://datasheet.ciiva.com/15120/getdatasheetpartid-628221-15120012.pdf?src-supplier=Verical; ComponentLink5URL: https://datasheet.ciiva.com/6622/lm1881-6622173.pdf?src-supplier=Digi-Key; ComponentLink5Description: https://datasheet.ciiva.com/6622/lm1881-6622173.pdf?src-supplier=Digi-Key; ComponentLink6URL: https://datasheet.ciiva.com/48707/001010689-da-01-en-ic-video-sync-se-lm1881m-nopb-soic-8-tid-48707237.pdf?src-supplier=Conrad; ComponentLink6Description: https://datasheet.ciiva.com/48707/001010689-da-01-en-ic-video-sync-se-lm1881m-nopb-soic-8-tid-48707237.pdf?src-supplier=Conrad; .SCHCHK: USED
footprint D0008A_N (SOIC, 8-Leads, Body 5x4mm, Pitch 1.27mm, IPC Medium Density)
pins: 1 COMP SYNC OUT (out), 2 COMP VID IN (in), 3 VERT SYNC OUT (out), 4 GND (power), 5 BURST/BP OUT (out), 6 R SET, 7 ODD/EVEN OUT (out), 8 VCC (power)

## IC-LM1881MX/NOPB
designator U?, comment LM1881MX/NOPB  Case/Package: SOIC8
IC VIDEO SYNC SEPARATOR 8-SOIC; Manufacturer: TI National Semiconductor; Max Supply Voltage: 5V; Max Power Dissipation: 1.1W; Operating Supply Current: 5.2mA; Power Consumption: 25mW; .Creator: F:TALI; .PCBCHK: USED; Washability: OK; Supplier 1: Digi-Key; Manufacturer Part Number: LM1881MX/NOPB; Stock 1: 9639; Pricing 1: 1=3.13, 10=2.809, 100=2.3017, 500=1.95944, 1000=1.65253 (USD); Mount: Surface Mount; Number of Pins: 8; Weight: 0.019048oz; Contact Plating: Tin; Min Operating Temperature: 0°C; Max Operating Temperature: 70°C; Packaging: Tape and Reel; Package Quantity: 2500; Radiation Hardening: No; REACH SVHC: No SVHC; Lead Free: Lead Free; ComponentLink1URL: https://www.verical.com/server-webapp/html/getDatasheet?partID=630017; ComponentLink1Description: https://www.verical.com/server-webapp/html/getDatasheet?partID=630017; ComponentLink2URL: http://www.ti.com/lit/ds/symlink/lm1881.pdf; ComponentLink2Description: http://www.ti.com/lit/ds/symlink/lm1881.pdf; Supplier Part Number 1: 296-47437-6-ND; .SCHCHK: USED
footprint SOIC8
pins: 1 CSOUT (out), 2 CVIN (in), 3 VSOUT (out), 4 GND (power), 5 BPOUT (out), 6 RSET (in), 7 OEOUT (out), 8 VCC (power)

## IC-LM2904BQDRQ1
designator U?, comment LM2904B
IC OPAMP GP 2 CIRCUIT 8SOIC; Manufacturer: Texas Instruments; Manufacturer Part Number: LM2904BQDRQ1; Supplier 1: Digi-Key; Supplier Part Number 1: 296-LM2904BQDRQ1CT-ND; Stock: 1587; Pricing: 1=0.44, 10=0.375, 25=0.35, 100=0.26, 250=0.22, 500=0.21, 1000=0.155 (USD); RoHS: No; ComponentLink1Description: datasheet; ComponentLink1URL: https://www.ti.com/lit/ds/symlink/lm2904-q1.pdf?HQS=TI-null-null-digikeymode-df-pf-null-wwe&ts=1602145041041
footprint SOIC8-D0008A_M (SOIC, 8-Leads, Body 5x4mm, Pitch 1.27mm, IPC Low Density)
part A pins: 1 OUT1, 2 IN1- (hiz), 3 IN1+ (hiz), 4 V- (power), 8 V+ (power)
part B pins: 5 IN2+ (hiz), 6 IN2- (hiz), 7 OUT2
part A text: +; -
part B text: +; -